# Altium footprint library std-th.PcbLib: 171 footprints (part 3 of 11)
Each footprint in its own frame and in the unit in brackets; x right, y up, seen from the top. Pads: shape width x height; smd on the part's side, far side on the other; paste and mask are expansions set on the pad; w line width, h text height; cw(c..) or ccw(c..) is an arc to the next point about the centre after c.
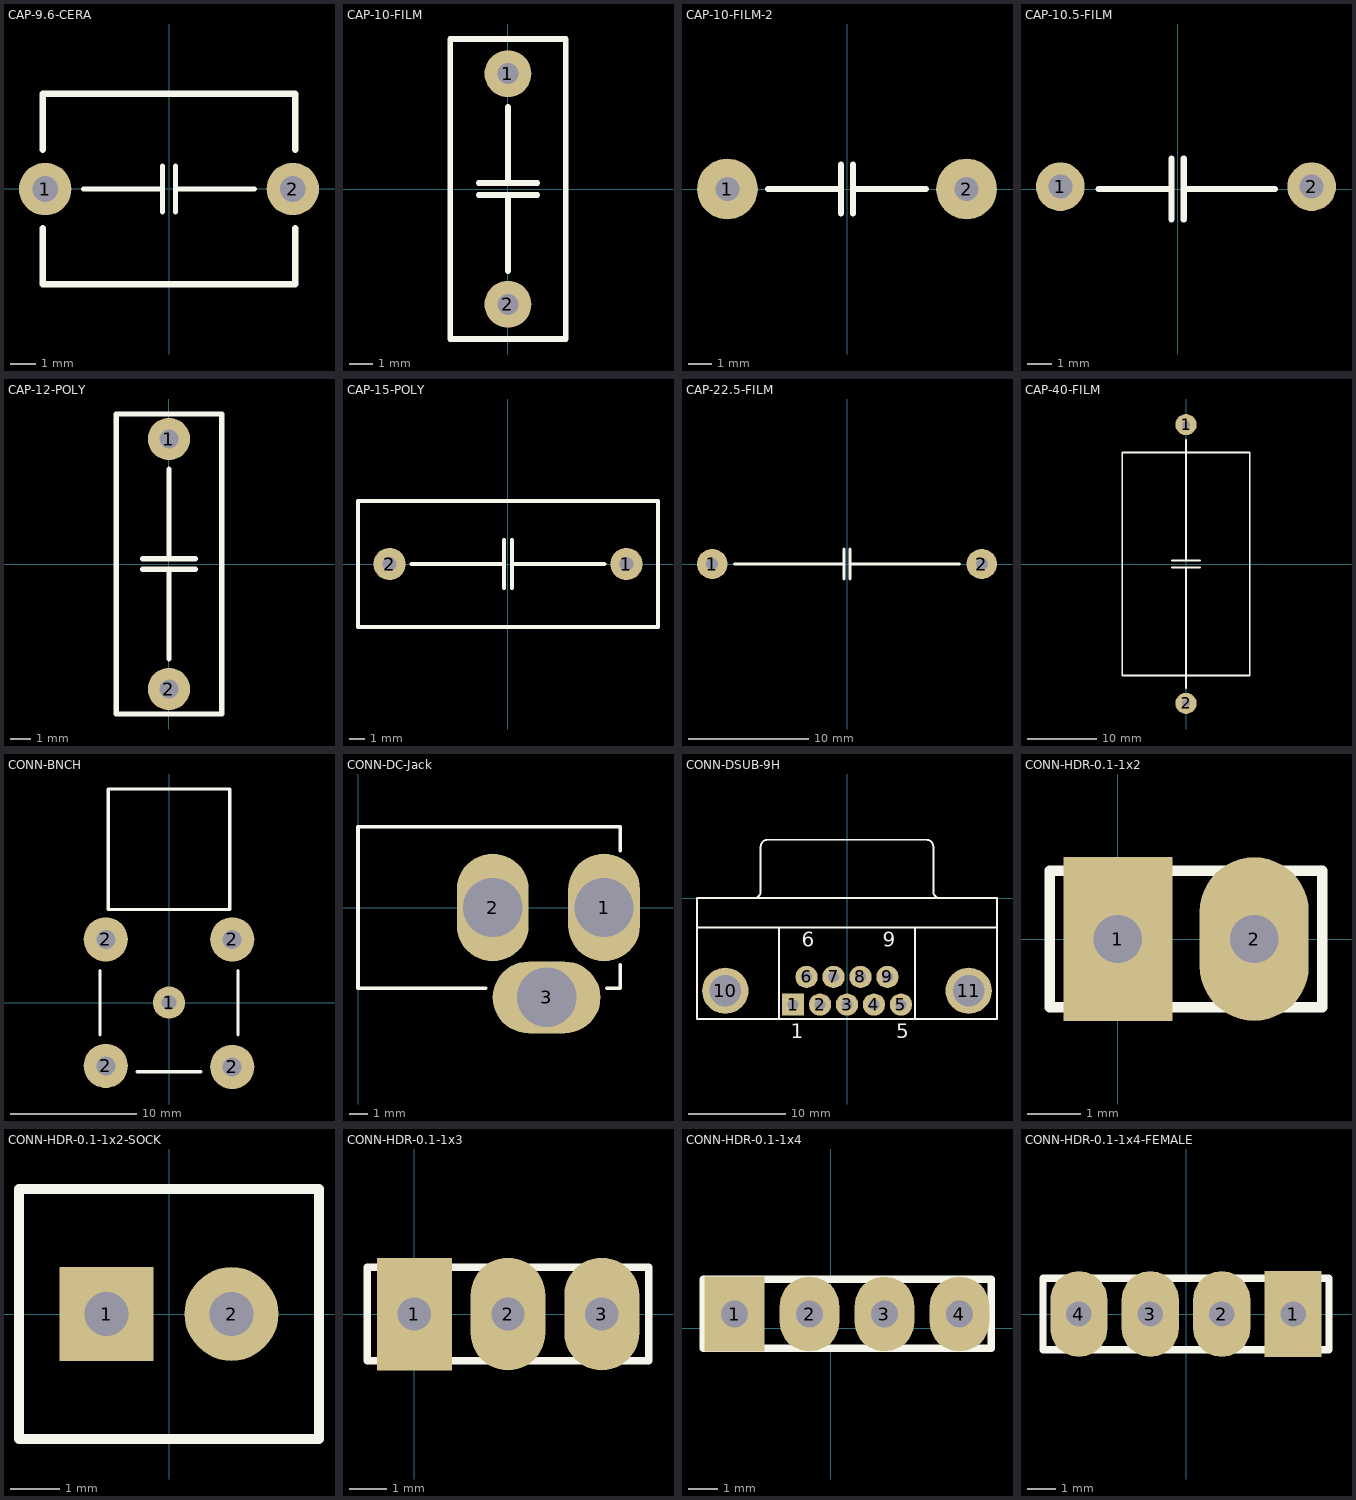
[diagram p2: the footprints below, top view; thin cyan lines are the x and y axes]

## CAP-9.6-CERA [mil] "Capacitor, 2 leads, 9.6 mm pitch"
height 287.4
pads (2):
  round 80 hole 39.37: 1(-188.98,-0.04) 2(188.93,0)
Top Overlay:
  lines w8: -130,0 -45,0 -10,0 ; -10,-35 -10,35 ; 10,-35 10,35 ; 10,0 130,0
  lines w10: -192.92,-60 -192.92,-145.67 192.91,-145.67 192.91,-60 ; -192.92,60 -192.92,145.67 192.91,145.67 192.91,60
3D body "cap.stp": height 275.59, standoff -129.92, extent -198.79,-145.67 198.75,145.67

## CAP-10-FILM [mil] "Capacitor, film, 2 leads, 10 mm pitch"
height 393.7
pads (2):
  round 80 hole 35.43: 1(0,196.85) 2(0,-196.85)
Top Overlay:
  lines w10: -50,-10 50,-10 ; -50,10 50,10 ; 0,-140 0,-10 ; 0,10 0,140 ; -98.42,-255.9 -98.42,255.91 98.44,255.91 98.44,-255.9 -98.42,-255.9
3D body "User Library-Capacitor MKT_B32591C3104 (Pitch 10mm).step": height 508.64, standoff -219.7, extent -98.42,-255.9 98.44,255.91

## CAP-10-FILM-2 [mm] "Capacitor, 10 mm pitch, film"
height 8
pads (2):
  round 2.54 hole 1: 1(-5,0) 2(5,0)
Top Overlay:
  lines w0.254: -3.302,0 -0.254,0 ; -0.254,-1.016 -0.254,1.016 ; 0.254,-1.016 0.254,1.016 ; 0.254,0 3.302,0
3D body "User Library-RAD CAP 12WMM.STEP": height 17.9, standoff -4.23, extent -6.06,-3.75 5.94,3.75

## CAP-10.5-FILM [mil] "Capacitor, 10.5 mm pitch, film"
height 314.96
pads (2):
  round 80 hole 39.37: 1(-193.01,3.86) 2(220.37,3.86)
Top Overlay:
  lines w10: -130,0 -10,0 ; -10,-50 -10,50 ; 10,-50 10,50 ; 10,0 160,0
3D body "User Library-RAD CAP 12_5MM.STEP": height 641.59, standoff -161.98, extent -232.13,-112.28 260,120

## CAP-12-POLY [mil] "Capacitor, Polymer, 2 leads, 12 mm pitch"
height 393.7
pads (2):
  round 80 hole 35.43: 1(0,237.5) 2(0,-237.5)
Top Overlay:
  lines w10: -50,-10 50,-10 ; -50,10 50,10 ; 0,-180 0,-10 ; 0,10 0,180 ; -99.99,-285 100.01,-285 100.01,285 -99.99,285 -99.99,-285
3D body "User Library-SV07AC104KAA.step": height 519.22, standoff -1230.78, extent -99.99,-285 100.01,285

## CAP-15-POLY [mil] "Capacitor, 2 leads, Polymer, 15 mm pitch"
height 393.7
pads (2):
  round 80 hole 35.43: 1(295.28,0) 2(-295.28,0)
Top Overlay:
  lines w10: -240,0 -10,0 ; -10,-60 -10,60 ; 10,-60 10,60 ; 10,0 240,0 ; -374.01,-157.48 374.03,-157.48 374.03,157.48 -374.01,157.48 -374.01,-157.48
3D body "User Library-CAP_POLY_15mm.step": height 627.91, standoff -159.49, extent -374.01,-157.48 374.03,157.48

## CAP-22.5-FILM [mm] "Capacitor, 22.5 mm pitch, film"
height 12
pads (2):
  round 2.54 hole 1: 1(-11.25,0) 2(11.25,0)
Top Overlay:
  lines w0.254: -9.398,0 -0.254,0 ; -0.254,-1.27 -0.254,1.27 ; 0.254,-1.27 0.254,1.27 ; 0.254,0 9.398,0
3D body "User Library-ECQE(F) 0_47uf 630Vdc 250Vac.step": height 20.5, standoff -3, extent -13,-4.65 13,4.65

## CAP-40-FILM [mil] "Capacitor, 2 leads, 40 mm pitch, high voltage"
height 787.4
pads (2):
  round 120 hole 43.31: 1(0,787.4) 2(0,-787.4)
Top Overlay:
  lines w10: -80,-20.02 79.77,-20.02 ; -80,20 79.77,20 ; -0.11,-20.02 -0.11,-50.03 -0.11,-150.08 0,-150.08 0,-700 ; -0.11,20 -0.11,50.01 -0.11,150.06 0,150.06 0,700 ; 360,-630 360,629.92 -360,629.92 -360,630 -360,510 -360,-629.92 360,-629.92
3D body "User Library-ICEL CAP.step": height 708.66, standoff -236.22, extent -354.32,-807.08 354.34,807.09

## CONN-BNCH [mm] "Connector, BNC, right angle"
pads (5):
  round 2.54 hole 1.2: 1(0,0)
  round 3.5 hole 1.5: 2(-5,-5) 2(-5,5) 2(5,-5.08) 2(5,5)
Top Overlay:
  lines w0.254: -5.461,-2.54 -5.461,2.54 ; -2.54,-5.461 2.54,-5.461 ; 5.461,-2.54 5.461,2.54 ; -4.8,7.366 4.8,7.366 4.8,16.9 -4.8,16.9 -4.8,7.366
3D body "User Library-Tyco Electronics BNC PCB socket (right angle) 1-1478035-0-1.step": height 19.92, standoff -2.73, extent -5.5,-5.5 5.5,16.9

## CONN-DC-Jack [mm] "DC Power Jack, 2.5mm, KLD Series, PCB Mount"
height 4.7
pads (3):
  oval 4x6 hole 3.3: 1(13.7,0) 2(7.5,0)
  oval 6x4 hole 3.3: 3(10.5,-5)
Top Overlay:
  lines w0.2: 7.112,-4.5 0,-4.5 0,4.5 14.6,4.5 14.6,3.175 ; 13.843,-4.5 14.6,-4.5 14.6,-3.175
Mechanical 1:
  text "Alert PCB fab to slot details" at 0.286,6.066 h0.3
  text "Assign keep-out area to slot" at 0.286,6.566 h0.3
  text "Mech 1 - Slot cut-out" at 0.286,5.566 h0.3
  text "Mech 2 - Clearance, move to internal plane if present" at 0.286,5.066 h0.3
3D body "PowerJack.step": height 11, standoff -3.5, extent 0,-4.9 14.5,4.5

## CONN-DSUB-9H [mm] "Connector; D Subminiature; 9 Position; Right Angle; Pitch 1.385 mm"
height 12.75
pads (11):
  rect 2.286x2.286 hole 1.09: 1(-5.54,-10.92)
  round 2.286 hole 1.09: 2(-2.77,-10.92) 3(0,-10.92) 4(2.77,-10.92) 5(5.54,-10.92) 6(-4.155,-8.08) 7(-1.385,-8.08) 8(1.385,-8.08) 9(4.155,-8.08)
  round 4.76 hole 3.26: 10(-12.495,-9.5) 11(12.495,-9.5)
Top Overlay:
  lines w0.2: -15.4,-3 15.4,-3 ; -9.56,0.005 ccw(c-9.56,0.7) -8.865,0.7 -8.865,5.3 ; -8.86,5.305 cw(c-8.165,5.305) -8.165,6 8.165,6 cw(c8.165,5.305) 8.86,5.305 ; -7,-12.4 -7,-3 ; 7,-12.4 7,-3 ; 8.865,5.3 8.865,0.7 ccw(c9.56,0.7) 9.56,0.005 ; -15.4,-12.4 -15.4,0 15.4,0 15.4,-12.4 -15.4,-12.4
  text "1" at -5.79,-14.375 h1.5
  text "5" at 5.04,-14.375 h1.5
  text "9" at 3.655,-4.975 h1.5
  text "6" at -4.655,-4.975 h1.5
3D body "SW3dPS-dsub.STEP": height 12.5, standoff -4.1, extent -15.618,-12.7 15.618,7.9

## CONN-HDR-0.1-1x2 [mil] "Header, 100 mil pitch, 2 way single row"
height 78.74
pads (2):
  rect 80x120 hole 35.43: 1(0,0)
  oval 80x120 hole 35.43: 2(100,0)
Top Overlay:
  lines w7.87: -50,-50 150,-50 150,50 -50,50 -50,-50
3D body "User Library-Header1x2.STEP": height 332.28, standoff -100, extent -49.99,-49.99 150.01,50.01

## CONN-HDR-0.1-1x2-SOCK [mm] "Header, socket, 1 row 2 way"
height 8
pads (2):
  rect 1.905x1.905 hole 0.9: 1(-1.27,0)
  round 1.905 hole 0.9: 2(1.27,0)
Top Overlay:
  lines w0.203: -3.048,-2.54 3.048,-2.54 3.048,2.54 -3.048,2.54 -3.048,-2.54
3D body "Header2way.stp": height 6.26, standoff -4.56, extent -3,-2.5 3,2.5

## CONN-HDR-0.1-1x3 [mil] "Connector; Header; 3 Position"
height 250
pads (3):
  rect 80x120 hole 35.43: 1(0,0)
  oval 80x120 hole 35.43: 2(100,0) 3(200,0)
Top Overlay:
  lines w7.87: -50,-50 250,-50 250,50 -50,50 -50,-50
3D body "User Library-PinHeaderX3.STEP": height 335.85, standoff -144.88, extent -49.99,-57.47 250.01,57.49

## CONN-HDR-0.1-1x4 [mil] "Header, 4 way, 100 mil pitch"
height 393.7
pads (4):
  rect 80x100 hole 35.43: 1(-128,19)
  oval 80x100 hole 35.43: 2(-28,19) 3(72,19) 4(172,19)
Top Overlay:
  lines w10: -169.99,-26.99 214.01,-26.99 214.01,65.01 -169.99,65.01 -169.99,-26.99
3D body "User Library-Header 4 Vertical.step": height 320, standoff -107, extent -169.99,-26.99 214.01,65.01

## CONN-HDR-0.1-1x4-FEMALE [mil] "Header, receptable, 4 way, 100 mil pitch"
height 314.96
pads (4):
  rect 80x120 hole 35.43: 1(150,0)
  oval 80x120 hole 35.43: 2(50,0) 3(-50,0) 4(-150,0)
Top Overlay:
  lines w10: -199.99,-49.99 200.01,-49.99 200.01,50.01 -199.99,50.01 -199.99,-49.99
3D body "User Library-RM254_4pin.step": height 237.01, standoff -122.05, extent -199.99,-49.99 200.01,50.01